# Altium integrated library Ice40_Mother_Board.IntLib: 23 symbols
Pins are listed as number, name and electrical type; pins without a type are passive.

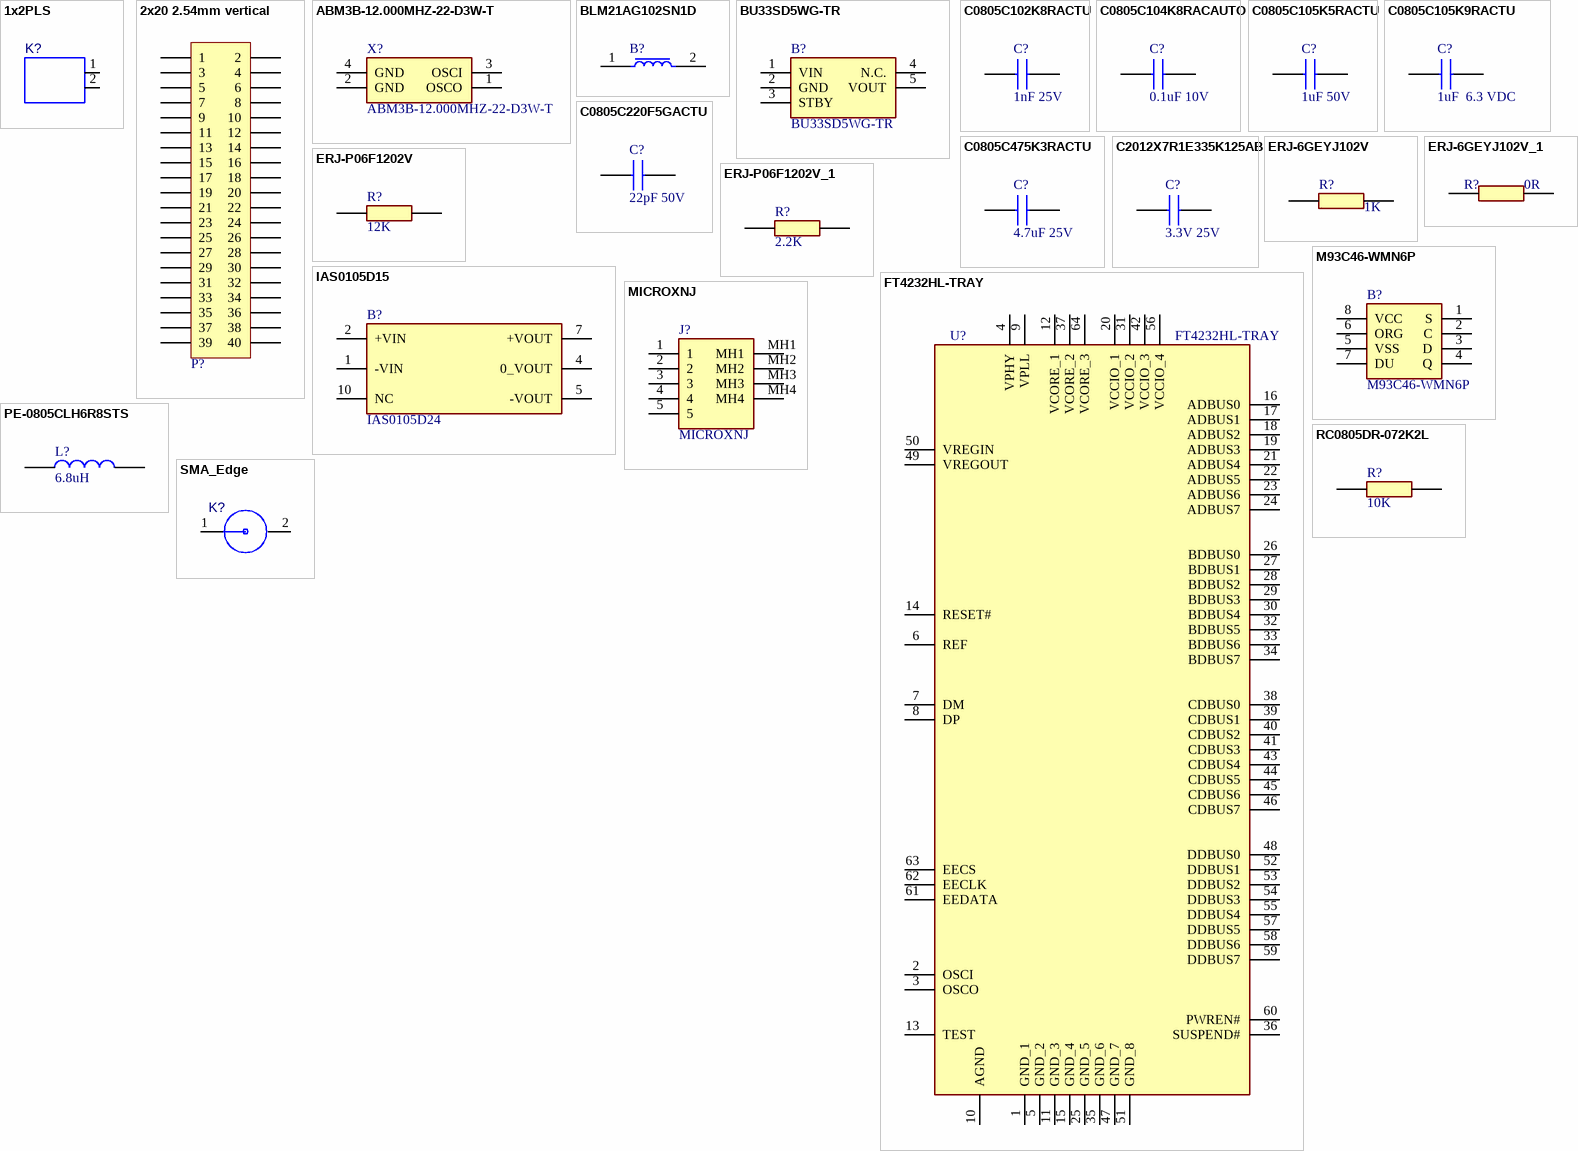
[diagram p0: symbols 1x2PLS to SMA_Edge]

## 1x2PLS
designator K?  (value not drawn)
Value: *
footprint 55342061
footprint 55342061_
pins: 1, 2

## 2x20 2.54mm vertical
designator P?  (value not drawn)
Header, 40-Pin; LatestRevisionDate: 17-Jul-2002; LatestRevisionNote: Re-released for DXP Platform.; Publisher: Altium Limited
footprint RHDR40W97P254X254_2X20_5130X508X860P
footprint RHDR40W97P254X254_2X20_5130X508X860P_
pins: 1, 2, 3, 4, 5, 6, 7, 8, 9, 10, 11, 12, 13, 14, 15, 16, 17, 18, 19, 20, 21, 22, 23, 24, 25, 26, 27, 28, 29, 30, 31, 32, 33, 34, 35, 36, 37, 38, 39, 40

## ABM3B-12.000MHZ-22-D3W-T
designator X?
Crystals 12MHz 22pF 25ppm -40C +85C; Manufacturer_Name: ABRACON; Manufacturer_Part_Number: ABM3B-12.000MHZ-22-D3W-T; Mouser Part Number: 815-ABM3B-12-22-D3WT; Mouser Price/Stock: https://www.mouser.co.uk/ProductDetail/ABRACON/ABM3B-12000MHZ-22-D3W-T?qs=mdWnPU%2FGekgGoMnpT5iuLA%3D%3D; Arrow Part Number: *; Arrow Price/Stock: *; Datasheet Link: https://abracon.com/Resonators/abm3b.pdf
footprint ABM3B
footprint ABM3B
pins: 1 OSCO, 2 GND, 3 OSCI, 4 GND

## BLM21AG102SN1D
designator B?  (value not drawn)
BLM21_N1D Series EMI Suppression Filter 1000+/-25% at 100MHz 600mA @85; Manufacturer_Name: Murata Electronics; Geometry.Height: 1.05mm; Manufacturer_Part_Number: BLM21AG102SN1D; Mouser Part Number: 81-BLM21AG102SN1; Mouser Price/Stock: https://www.mouser.co.uk/ProductDetail/Murata-Electronics/BLM21AG102SN1D?qs=OoMRb4U3ghiVKbYhfeUHEA%3D%3D; Arrow Part Number: BLM21AG102SN1D; Arrow Price/Stock: https://www.arrow.com/en/products/blm21ag102sn1d/murata-manufacturing?region=nac; Datasheet Link: https://www.murata.com/en-us/products/productdetail?partno=BLM21AG102SN1%23
footprint BLM21AG102BH1J
pins: 1, 2

## BU33SD5WG-TR
designator B?
LDO regulator,3.3V,0.5A,standby,SSOP5 ROHM BU33SD5WG-TR, LDO Voltage Regulator, 0.5A, 3.3 V +/-2%, 1.7  6 Vin, 5-Pin SSOP; Manufacturer_Name: ROHM Semiconductor; Geometry.Height: 1.25mm; Manufacturer_Part_Number: BU33SD5WG-TR; Mouser Part Number: 755-BU33SD5WG-TR; Mouser Price/Stock: https://www.mouser.co.uk/ProductDetail/ROHM-Semiconductor/BU33SD5WG-TR?qs=%2FKR40Cd6GUrQDzRkUEt69Q%3D%3D; Arrow Part Number: *; Arrow Price/Stock: *; Datasheet Link: https://componentsearchengine.com/Datasheets/1/BU33SD5WG-TR.pdf
footprint SOT95P280X125-5N
footprint SOT95P280X125-5N_
pins: 1 VIN, 2 GND, 3 STBY, 4 N.C., 5 VOUT

## C0805C102K8RACTU
designator C?, comment 1nF 25V
SMD Comm X7R, Ceramic, 1000 pF, 10%, 10 VDC, 25 VDC, 125C, -55C, X7R, SMD, MLCC, Temperature Stable, Class II, 5 % , 100 GOhms, 11 mg, 0805, 2mm, 1.25mm, 0.78mm, 0.75mm, 0.5mm, 4000, 78  Weeks, 80; Manufacturer_Name: KEMET; Manufacturer_Part_Number: C0805C102K8RACTU; Geometry.Height: 1.1mm; Mouser Part Number: 80-C0805C102K8R; Mouser Price/Stock: https://www.mouser.co.uk/ProductDetail/KEMET/C0805C102K8RACTU?qs=89eQnnNloViWkbrXkPqh5g%3D%3D; Arrow Part Number: C0805C102K8RACTU; Arrow Price/Stock: https://www.arrow.com/en/products/c0805c102k8ractu/kemet-corporation; Datasheet Link: https://content.kemet.com/datasheets/KEM_C1002_X7R_SMD.pdf
footprint C0805 (Chip Capacitor, Body 2.0x1.3mm, IPC High Density)
pins: 1, 2

## C0805C104K8RACAUTO
designator C?, comment 0.1uF 10V
SMD Auto X7R, Ceramic, 0.1 uF, 10%, 10 VDC, 25 VDC, 125C, -55C, X7R, SMD, MLCC, Temperature Stable, Automotive Grade, 5 % , 10 GOhms, 11 mg, 0805, 2mm, 1.25mm, 0.78mm, 0.75mm, 0.5mm, 4000, 78  Weeks, 80; Manufacturer_Name: KEMET; Manufacturer_Part_Number: C0805C104K8RACAUTO; Geometry.Height: 1.1mm; Mouser Part Number: 80-C0805C104K8RAUTO; Mouser Price/Stock: https://www.mouser.co.uk/ProductDetail/KEMET/C0805C104K8RACAUTO?qs=ds50AKTGxA8vmn6TMGYnqg%3D%3D; Arrow Part Number: C0805C104K8RACAUTO; Arrow Price/Stock: https://www.arrow.com/en/products/c0805c104k8racauto/kemet-corporation?region=nac; Datasheet Link: https://content.kemet.com/datasheets/KEM_C1023_X7R_AUTO_SMD.pdf
footprint C0805 (Chip Capacitor, Body 2.0x1.3mm, IPC High Density)
pins: 1, 2

## C0805C105K5RACTU
designator C?, comment 1uF 50V
SMD Comm X7R, Ceramic, 1 uF, 10%, 50 VDC, 125 VDC, 125C, -55C, X7R, SMD, MLCC, Temperature Stable, Class II, 10 % , 100 MOhms, 21 mg, 0805, 2mm, 1.25mm, 1.25mm, 0.75mm, 0.5mm, 2500, 78  Weeks, 80; Manufacturer_Name: KEMET; Manufacturer_Part_Number: C0805C105K5RACTU; Geometry.Height: 1.1mm; Mouser Part Number: 80-C0805C105K5R; Mouser Price/Stock: https://www.mouser.co.uk/ProductDetail/KEMET/C0805C105K5RACTU?qs=iP0bYSAMAFrBrUflcErrLQ%3D%3D; Arrow Part Number: C0805C105K5RACTU; Arrow Price/Stock: https://www.arrow.com/en/products/c0805c105k5ractu/kemet-corporation?region=nac; Datasheet Link: https://content.kemet.com/datasheets/KEM_C1002_X7R_SMD.pdf
footprint C0805 (Chip Capacitor, Body 2.0x1.3mm, IPC High Density)
pins: 1, 2

## C0805C105K9RACTU
designator C?, comment 1uF  6.3 VDC
SMD Comm X7R, Ceramic, 1 uF, 10%, 6.3 VDC, 15.75 VDC, 125C, -55C, X7R, SMD, MLCC, Temperature Stable, Class II, 5 % , 500 MOhms, 13 mg, 0805, 2mm, 1.25mm, 1.25mm, 0.75mm, 0.5mm, 2500, 78  Weeks, 80; Manufacturer_Name: KEMET; Manufacturer_Part_Number: C0805C105K9RACTU; Geometry.Height: 1.1mm; Mouser Part Number: 80-C0805C105K9R; Mouser Price/Stock: https://www.mouser.co.uk/ProductDetail/KEMET/C0805C105K9RACTU?qs=Nnkldhwoc36daYb4WU%2Fecw%3D%3D; Arrow Part Number: C0805C105K9RACTU; Arrow Price/Stock: https://www.arrow.com/en/products/c0805c105k9ractu/kemet-corporation; Datasheet Link: https://content.kemet.com/datasheets/KEM_C1002_X7R_SMD.pdf
footprint C0805 (Chip Capacitor, Body 2.0x1.3mm, IPC High Density)
pins: 1, 2

## C0805C220F5GACTU
designator C?, comment 22pF 50V
SMD Comm C0G, Ceramic, 22 pF, 1%, 50 VDC, 125 VDC, 125C, -55C, C0G, SMD, MLCC, Ultra-Stable, Low Loss, Class I, 0.1 % , 100 GOhms, 8 mg, 0805, 2mm, 1.25mm, 0.7mm, 0.75mm, 0.5mm, 4000, 78  Weeks, 120; Manufacturer_Name: KEMET; Manufacturer_Part_Number: C0805C220F5GACTU; Geometry.Height: 1.1mm; Mouser Part Number: 80-C0805C220F5G; Mouser Price/Stock: https://www.mouser.co.uk/ProductDetail/KEMET/C0805C220F5GACTU/?qs=RXK%252BYb%252BisXRjMukjg6azjA%3D%3D; Arrow Part Number: C0805C220F5GACTU; Arrow Price/Stock: https://www.arrow.com/en/products/c0805c220f5gactu/kemet-corporation; Datasheet Link: https://content.kemet.com/datasheets/KEM_C1003_C0G_SMD.pdf
footprint C0805 (Chip Capacitor, Body 2.0x1.3mm, IPC High Density)
pins: 1, 2

## C0805C475K3RACTU
designator C?, comment 4.7uF 25V
SMD Comm X7R, Ceramic, 4.7 uF, 10%, 25 VDC, 62.5 VDC, 125C, -55C, X7R, SMD, MLCC, Temperature Stable, Class II, 10 % , 21.3 MOhms, 21 mg, 0805, 2mm, 1.25mm, 1.25mm, 0.75mm, 0.5mm, 2500, 78  Weeks, 80; Manufacturer_Name: KEMET; Manufacturer_Part_Number: C0805C475K3RACTU; Geometry.Height: 1.1mm; Mouser Part Number: 80-C0805C475K3RACTU; Mouser Price/Stock: https://www.mouser.co.uk/ProductDetail/KEMET/C0805C475K3RACTU?qs=PzGy0jfpSMsRb1o8vMQxfQ%3D%3D; Arrow Part Number: C0805C475K3RACTU; Arrow Price/Stock: https://www.arrow.com/en/products/c0805c475k3ractu/kemet-corporation?region=nac; Datasheet Link: https://content.kemet.com/datasheets/KEM_C1002_X7R_SMD.pdf
footprint C0805 (Chip Capacitor, Body 2.0x1.3mm, IPC High Density)
pins: 1, 2

## C2012X7R1E335K125AB
designator C?, comment 3.3V 25V
TDK 0805 C 3.3uF Ceramic Multilayer Capacitor, 25 V dc, +125C, X7R Dielectric, +/-10%; Manufacturer_Part_Number: C2012X7R1E335K125AB; Geometry.Height: 0.75mm; Manufacturer_Name: TDK; Mouser Part Number: 810-C2012X7R1E335K; Mouser Price/Stock: https://www.mouser.co.uk/ProductDetail/TDK/C2012X7R1E335K125AB?qs=NRhsANhppD%2FtCJRQfh%252BIMA%3D%3D; Arrow Part Number: *; Arrow Price/Stock: *; Datasheet Link: https://product.tdk.com/system/files/dam/doc/product/capacitor/ceramic/mlcc/catalog/mlcc_commercial_general_en.pdf
footprint C0805 (Chip Capacitor, Body 2.0x1.3mm, IPC High Density)
pins: 1, 2

## ERJ-6GEYJ102V
designator R?, comment 1K
RESISTOR, 0805 1K Ohm +/-5% 0.125 W; Manufacturer_Name: Panasonic; Manufacturer_Part_Number: ERJ-6GEYJ102V; Mouser Part Number: 667-ERJ-6GEYJ102V; Mouser Price/Stock: https://www.mouser.co.uk/ProductDetail/Panasonic/ERJ-6GEYJ102V?qs=tQNqqtTOejLZQ8YYVXgJXw%3D%3D; Arrow Part Number: ERJ-6GEYJ102V; Arrow Price/Stock: https://www.arrow.com/en/products/erj-6geyj102v/panasonic?region=europe; Datasheet Link: *
footprint RESC2013X65N
footprint 6-0805_M (Chip Resistor, Body 2.0x1.2mm, IPC Low Density)
pins: 1 R1, 2 R2

## ERJ-6GEYJ102V_1
designator R?, comment 0R
RESISTOR, 0805 1K Ohm +/-5% 0.125 W; Manufacturer_Name: Panasonic; Manufacturer_Part_Number: ERJ-6GEYJ102V; Mouser Part Number: 667-ERJ-6GEYJ102V; Mouser Price/Stock: https://www.mouser.co.uk/ProductDetail/Panasonic/ERJ-6GEYJ102V?qs=tQNqqtTOejLZQ8YYVXgJXw%3D%3D; Arrow Part Number: ERJ-6GEYJ102V; Arrow Price/Stock: https://www.arrow.com/en/products/erj-6geyj102v/panasonic?region=europe; Datasheet Link: *
footprint RESC2013X65N
footprint 6-0805_M (Chip Resistor, Body 2.0x1.2mm, IPC Low Density)
footprint 0603-R
pins: 1 R1, 2 R2

## ERJ-P06F1202V
designator R?, comment 12K
Thick Film Resistors - SMD 0805 12Kohms 0.5W 1% AEC-Q200; Manufacturer_Name: Panasonic; Manufacturer_Part_Number: ERJ-P06F1202V; Geometry.Height: 0.7mm; Mouser Part Number: 667-ERJ-P06F1202V; Mouser Price/Stock: https://www.mouser.com/Search/Refine.aspx?Keyword=667-ERJ-P06F1202V; Arrow Part Number: ERJ-P06F1202V; Arrow Price/Stock: https://www.arrow.com/en/products/erj-p06f1202v/panasonic; Datasheet Link: https://industrial.panasonic.com/cdbs/www-data/pdf/RDO0000/AOA0000C331.pdf
footprint ERJP06_(0805)
footprint 6-0805_M (Chip Resistor, Body 2.0x1.2mm, IPC Low Density)
pins: 1, 2

## ERJ-P06F1202V_1
designator R?, comment 2.2K
Thick Film Resistors - SMD 0805 12Kohms 0.5W 1% AEC-Q200; Manufacturer_Name: Panasonic; Manufacturer_Part_Number: ERJ-P06F1202V; Geometry.Height: 0.7mm; Mouser Part Number: 667-ERJ-P06F1202V; Mouser Price/Stock: https://www.mouser.com/Search/Refine.aspx?Keyword=667-ERJ-P06F1202V; Arrow Part Number: ERJ-P06F1202V; Arrow Price/Stock: https://www.arrow.com/en/products/erj-p06f1202v/panasonic; Datasheet Link: https://industrial.panasonic.com/cdbs/www-data/pdf/RDO0000/AOA0000C331.pdf
footprint ERJP06_(0805)
footprint 6-0805_M (Chip Resistor, Body 2.0x1.2mm, IPC Low Density)
pins: 1, 2

## FT4232HL-TRAY
designator U?
IC USB HS QUAD UART/SYNC 64-LQFP; Manufacturer_Name: FTDI Chip; Geometry.Height: 1.6mm; Manufacturer_Part_Number: FT4232HL-TRAY; Mouser Part Number: 895-FT4232HL-TRAY; Mouser Price/Stock: https://www.mouser.co.uk/ProductDetail/FTDI/FT4232HL-TRAY?qs=LsYZF85lA7ZOH9FvmmPH7w%3D%3D; Arrow Part Number: FT4232HL-TRAY; Arrow Price/Stock: https://www.arrow.com/en/products/ft4232hl-tray/ftdi-chip; Datasheet Link: https://www.ftdichip.com/Support/Documents/DataSheets/ICs/DS_FT4232H.pdf
footprint QFP50P1200X1200X160-64N
pins: 1 GND_1, 2 OSCI, 3 OSCO, 4 VPHY, 5 GND_2, 6 REF, 7 DM, 8 DP, 9 VPLL, 10 AGND, 11 GND_3, 12 VCORE_1, 13 TEST, 14 RESET#, 15 GND_4, 16 ADBUS0, 17 ADBUS1, 18 ADBUS2, 19 ADBUS3, 20 VCCIO_1, 21 ADBUS4, 22 ADBUS5, 23 ADBUS6, 24 ADBUS7, 25 GND_5, 26 BDBUS0, 27 BDBUS1, 28 BDBUS2, 29 BDBUS3, 30 BDBUS4, 31 VCCIO_2, 32 BDBUS5, 33 BDBUS6, 34 BDBUS7, 35 GND_6, 36 SUSPEND#, 37 VCORE_2, 38 CDBUS0, 39 CDBUS1, 40 CDBUS2, 41 CDBUS3, 42 VCCIO_3, 43 CDBUS4, 44 CDBUS5, 45 CDBUS6, 46 CDBUS7, 47 GND_7, 48 DDBUS0, 49 VREGOUT, 50 VREGIN, 51 GND_8, 52 DDBUS1, 53 DDBUS2, 54 DDBUS3, 55 DDBUS4, 56 VCCIO_4, 57 DDBUS5, 58 DDBUS6, 59 DDBUS7, 60 PWREN#, 61 EEDATA, 62 EECLK, 63 EECS, 64 VCORE_3

## IAS0105D15
designator B?, comment IAS0105D24
Isolated DC/DC Converters DC-DC, 1W, UNREGULATED, DUAL OUTPUT, SMD; Manufacturer_Name: XP POWER; Manufacturer_Part_Number: IAS0105D15; Geometry.Height: 7.75mm; Mouser Part Number: 209-IAS0105D15; Mouser Price/Stock: https://www.mouser.co.uk/ProductDetail/XP-Power/IAS0105D15?qs=Cb2nCFKsA8ol8aKojAQnyQ%3D%3D; Arrow Part Number: *; Arrow Price/Stock: *; Datasheet Link: https://www.xppower.com/portals/0/pdfs/SF_IAS01.pdf
footprint IAS0105D15
footprint IAS0105D15_
pins: 1 -VIN, 2 +VIN, 4 0_VOUT, 5 -VOUT, 7 +VOUT, 10 NC

## M93C46-WMN6P
designator B?
M93C46-WMN6P, Serial EEPROM Memory 1kbit, Serial-Microwire, 200ns 2.5  5.5 V, 8-Pin; Manufacturer_Name: STMicroelectronics; Geometry.Height: 1.75mm; Manufacturer_Part_Number: M93C46-WMN6P; Mouser Part Number: 511-M93C46-WMN6P; Mouser Price/Stock: https://www.mouser.co.uk/ProductDetail/STMicroelectronics/M93C46-WMN6P?qs=GGwmtXQPF%2FlC4u8YDwI7hg%3D%3D; Arrow Part Number: *; Arrow Price/Stock: *; Datasheet Link: http://www.st.com/st-web-ui/static/active/en/resource/technical/document/datasheet/CD00001142.pdf
footprint SOIC127P600X175-8N
pins: 1 S, 2 C, 3 D, 4 Q, 5 VSS (power), 6 ORG, 7 DU, 8 VCC (power)

## MICROXNJ
designator J?
Connector; Manufacturer_Name: Shou Han; Datasheet Link: https://datasheet.lcsc.com/szlcsc/1912111437_SHOU-HAN-MicroXNJ_C404969.pdf; Height: 2.425mm; Manufacturer_Part_Number: MICROXNJ
footprint MICROXNJ
pins: 1, 2, 3, 4, 5, MH1, MH2, MH3, MH4

## PE-0805CLH6R8STS
designator L?, comment 6.8uH
Fixed Inductors 0805 6.8uH 600mA DCR=420mOhms RF; Manufacturer_Name: Pulse; Manufacturer_Part_Number: PE-0805CLH6R8STS; Geometry.Height: 1.1mm; Mouser Part Number: 673-PE-0805CLH6R8STS; Mouser Price/Stock: https://www.mouser.co.uk/ProductDetail/Pulse-Electronics/PE-0805CLH6R8STS?qs=P1JMDcb91o4zi65tQL%252BIoA%3D%3D; Arrow Part Number: *; Arrow Price/Stock: *; Datasheet Link: https://www.mouser.com/datasheet/2/336/PLEI_S_A0011079421_1-2514267.pdf
footprint INDC2012X110N
footprint INDC2012X110N_
pins: 1, 2

## RC0805DR-072K2L
designator R?, comment 10K
Thick Film Resistors - SMD 2.2 kOhms 125 mW 0805 1%; Manufacturer_Name: YAGEO; Manufacturer_Part_Number: RC0805DR-072K2L; Geometry.Height: 0.6mm; Mouser Part Number: 603-RC0805DR-072K2L; Mouser Price/Stock: https://www.mouser.co.uk/ProductDetail/YAGEO/RC0805DR-072K2L?qs=9h0bZHM%2F3zISsQK01v%2Fg%2FQ%3D%3D; Arrow Part Number: *; Arrow Price/Stock: *; Datasheet Link: https://www.yageo.com/upload/media/product/productsearch/datasheet/rchip/PYu-RC_Group_51_RoHS_L_11.pdf
footprint RESC2012X60N
footprint 6-0805_M (Chip Resistor, Body 2.0x1.2mm, IPC Low Density)
pins: 1, 2

## SMA_Edge
designator K?  (value not drawn)
Value: *
footprint AMPHENOL_132357-11_
pins: 1, 2